# Altium footprint library Udemy_PCB_LIB.PcbLib: 35 footprints (part 2 of 3)
Each footprint in its own frame and in the unit in brackets; x right, y up, seen from the top. Pads: shape width x height; smd on the part's side, far side on the other; paste and mask are expansions set on the pad; w line width, h text height; cw(c..) or ccw(c..) is an arc to the next point about the centre after c.
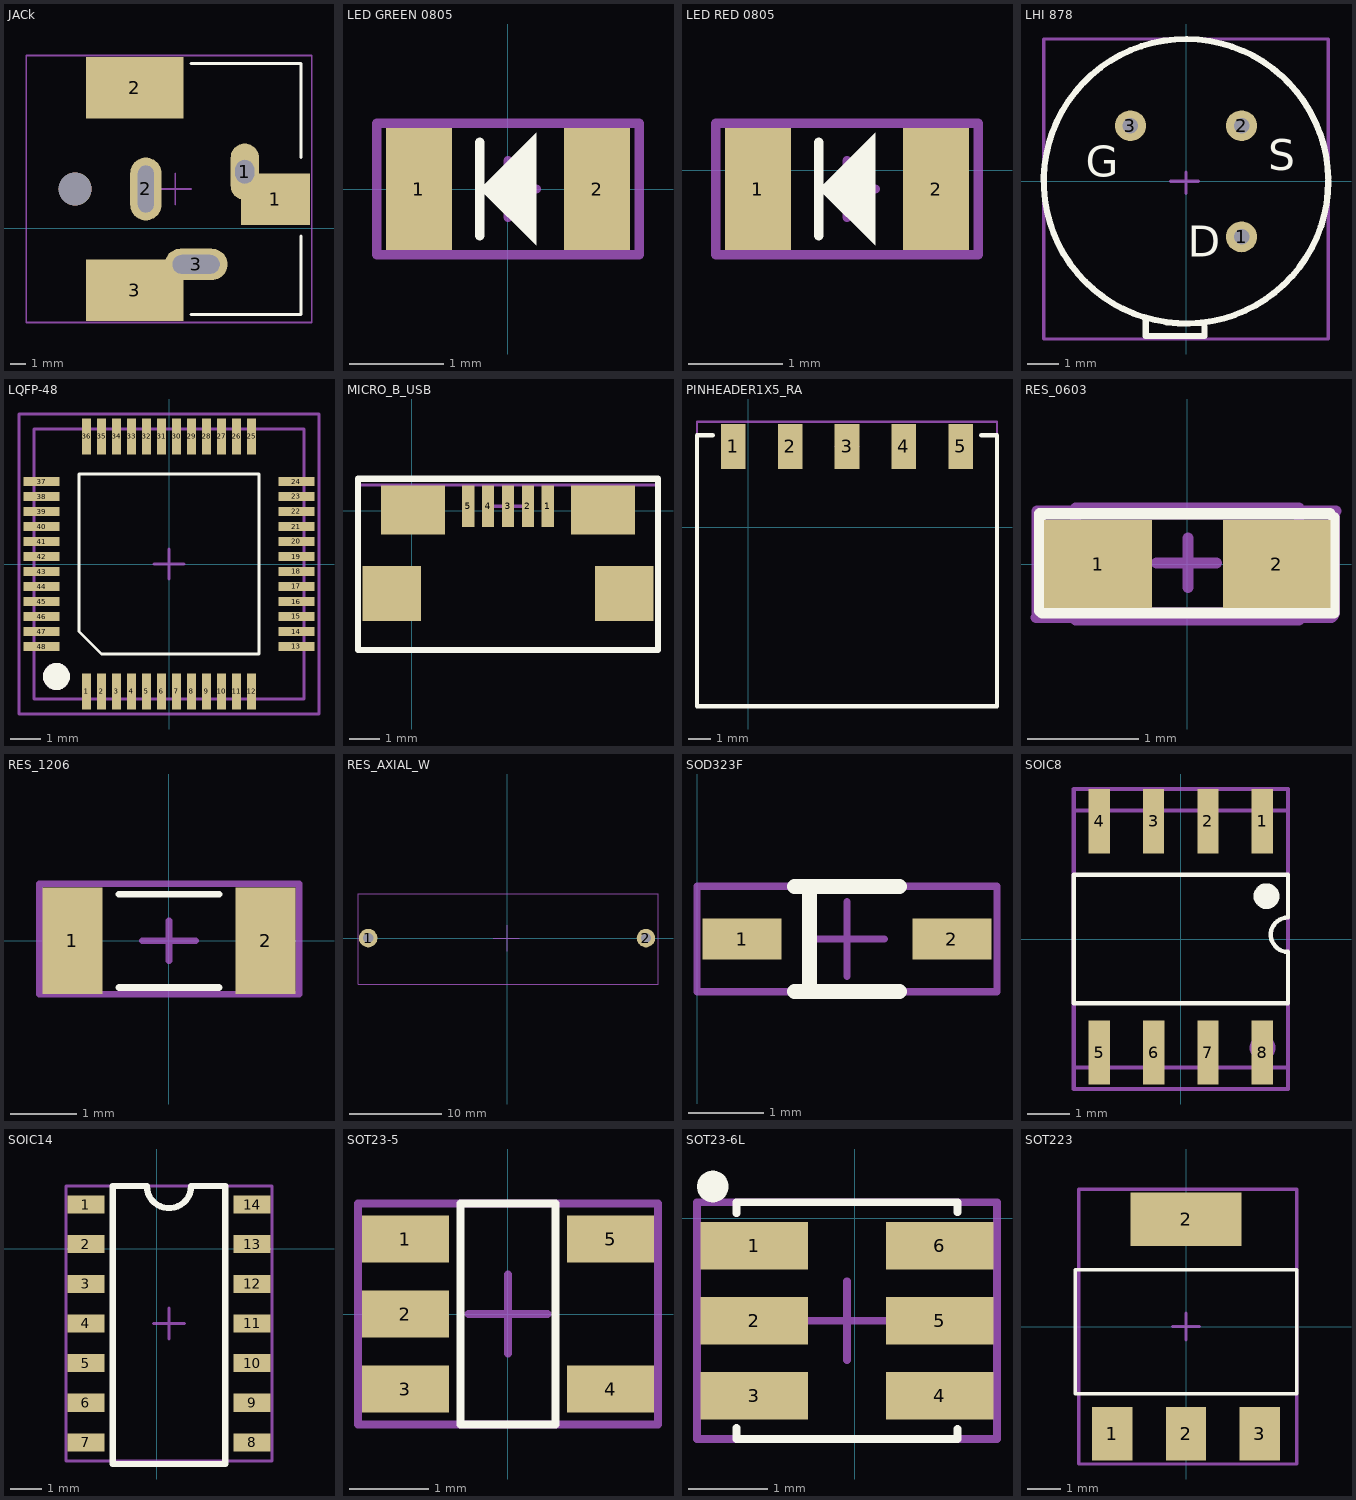
[diagram p1: the footprints below, top view; thin cyan lines are the x and y axes]

## JACk [mm]
pads (7):
  oval 1.8x3.6 hole 1.2 slot 1.5 at 90 deg: 1(18.025,3.6)
  rect 4.4x3.3 smd: 1(19.975,1.85)
  rect 6.2x3.9 smd: 2(11.025,8.95) 3(11.025,-3.95)
  oval 2x4 hole 1 slot 3 at 90 deg: 2(11.725,2.5)
  oval 4x2 hole 1.2 slot 3 at 0 deg: 3(14.925,-2.3)
  round 2.1 hole 2.1 unplated: ""(7.225,2.5)
Top Overlay:
  lines w0.2: 14.6,-5.5 21.6,-5.5 21.6,-0.5 ; 14.6,10.5 21.6,10.5 21.6,4.5
Top 3D Body:
  lines w0.1: 12.6,2.5 14.6,2.5 ; 13.6,1.5 13.6,3.5 ; 4.1,-6 4.1,11 7.6,11 22.3,11 22.3,-6 4.1,-6
Bottom Designator:
  lines w0.1: 4.1,-6 4.1,11 7.6,11 22.3,11 22.3,-6 4.1,-6
  text "'.Designator'" at 7.854,2.262 h1.52
3D body "CUI_DEVICES_PJ-037AH-SMT-TR.step": height 11.1, standoff -3.3, extent 4.125,-5.25 21.225,9.95

## LED GREEN 0805 [mm]
pads (2):
  rect 0.7x1.3 smd mask+0.05: 1(-0.95,0) 2(0.95,0)
Top Overlay:
  region: -0.3,0 0.3,0.6 0.3,-0.6
  lines w0.1: -0.3,-0.5 -0.3,0.5
Top 3D Body:
  lines w0.1: -0.3,0 0.3,0 ; 0,-0.3 0,0.3 ; -1.4,-0.7 1.4,-0.7 1.4,0.7 -1.4,0.7 -1.4,-0.7
Bottom Designator:
  lines w0.1: -1.4,-0.7 1.4,-0.7 1.4,0.7 -1.4,0.7 -1.4,-0.7
  text "'.Designator'" at -1.25,-0.317 h0.7
3D body "SMD_0805LED_GREEN.STEP": height 1.1, standoff 0, extent -1.01,-0.625 1.01,0.625

## LED RED 0805 [mm]
pads (2):
  rect 0.7x1.3 smd mask+0.05: 1(-3.15,-0.2) 2(-1.25,-0.2)
Top Overlay:
  region: -2.5,-0.2 -1.9,0.4 -1.9,-0.8
  lines w0.1: -2.5,-0.7 -2.5,0.3
Top 3D Body:
  lines w0.1: -2.5,-0.2 -1.9,-0.2 ; -2.2,-0.5 -2.2,0.1 ; -3.6,-0.9 -0.8,-0.9 -0.8,0.5 -3.6,0.5 -3.6,-0.9
Bottom Designator:
  lines w0.1: -3.6,-0.9 -0.8,-0.9 -0.8,0.5 -3.6,0.5 -3.6,-0.9
  text "'.Designator'" at -3.45,-0.517 h0.7
3D body "SMD_0805LED_RED.STEP": height 1.1, standoff 0, extent -3.21,-0.825 -1.19,0.425

## LHI 878 [mm]
pads (3):
  round 1 hole 0.5: 1(1.796,-1.796) 2(1.796,1.796) 3(-1.796,1.796)
Top Overlay:
  lines w0.05: -1.3,-5 -1.3,-4.5
  lines w0.2: -1.3,-4.5 -1.3,-5 0.6,-5 0.6,-4.7 ; 4.599,0.096 ccw(c0,0) 4.6,0
  text "D" at 0.054,-2.446 h1
  text "S" at 2.654,0.354 h1
  text "G" at -3.246,0.154 h1
Top Component Center:
  lines w0.1: -0.5,0 0.4,0 ; 0,-0.4 0,0.3 ; -4.6,-5.1 4.6,-5.1 4.6,4.6 -4.6,4.6 -4.6,-5.1
Top Designator:
  lines w0.1: -4.6,-5.1 -4.6,4.6 4.6,4.6 4.6,-5.1 -4.6,-5.1
  text ".Designator" at -2.746,-0.938 h1.52
3D body "User Library-LHI878.step": height 4.6, standoff -2.4, extent -4.6,-5.029 4.6,4.6

## LQFP-48 [mm] "7mm x 7mm"
pads (48):
  rect 0.3x1.2 smd mask+0.05: 1(-2.75,-4.25) 2(-2.25,-4.25) 3(-1.75,-4.25) 4(-1.25,-4.25) 5(-0.75,-4.25) 6(-0.25,-4.25) 7(0.25,-4.25) 8(0.75,-4.25) 9(1.25,-4.25) 10(1.75,-4.25) 11(2.25,-4.25) 12(2.75,-4.25) 25(2.75,4.25) 26(2.25,4.25) 27(1.75,4.25) 28(1.25,4.25) 29(0.75,4.25) 30(0.25,4.25) 31(-0.25,4.25) 32(-0.75,4.25) 33(-1.25,4.25) 34(-1.75,4.25) 35(-2.25,4.25) 36(-2.75,4.25)
  rect 1.2x0.3 smd mask+0.05: 13(4.25,-2.75) 14(4.25,-2.25) 15(4.25,-1.75) 16(4.25,-1.25) 17(4.25,-0.75) 18(4.25,-0.25) 19(4.25,0.25) 20(4.25,0.75) 21(4.25,1.25) 22(4.25,1.75) 23(4.25,2.25) 24(4.25,2.75) 37(-4.25,2.75) 38(-4.25,2.25) 39(-4.25,1.75) 40(-4.25,1.25) 41(-4.25,0.75) 42(-4.25,0.25) 43(-4.25,-0.25) 44(-4.25,-0.75) 45(-4.25,-1.25) 46(-4.25,-1.75) 47(-4.25,-2.25) 48(-4.25,-2.75)
Top Overlay:
  circle w0.5: c-3.75,-3.75 r0.2
  lines w0.1: -3,-2.25 -3,3 3,3 3,-3 -2.25,-3 -3,-2.25
Top Component Center:
  lines w0.1: -0.5,0 0.5,0 ; 0,-0.5 0,0.5 ; -5,-5 5,-5 5,5 -5,5 -5,-5
Top 3D Body:
  circle w0.5: c-3.75,-3.75 r0.2
  lines w0.1: -4.5,-4.5 4.5,-4.5 4.5,4.5 -4.5,4.5 -4.5,-4.5
Top Designator:
  lines w0.1: -5,-5 5,-5 5,5 -5,5 -5,-5
  text ".Designator" at -0.868,-0.508 h1.52
3D body "User Library-LQFP48_Grid_0_5.STEP": height 1.6, standoff 0, extent -4.5,-4.5 4.5,4.5

## MICRO_B_USB [mm]
pads (9):
  rect 0.4x1.35 smd mask+0.05: 1(4.44,0.144) 2(3.79,0.144) 3(3.14,0.144) 4(2.49,0.144) 5(1.84,0.144)
  rect 1.9x1.8 smd mask+0.05: ""(-0.66,-2.706) ""(6.94,-2.706)
  rect 2.1x1.6 smd mask+0.05: ""(0.04,0.021) ""(6.24,0.021)
Top Overlay:
  lines w0.2: -1.76,-4.556 -0.66,-4.556 8.04,-4.556 8.04,1.044 -1.76,1.044 -1.76,-4.556
Top 3D Body:
  lines w0.1: 2.64,0.144 3.64,0.144 ; 3.14,-0.356 3.14,0.644 ; -1.76,-4.556 8.04,-4.556 8.04,0.844 2.94,0.844 -1.76,0.844 -1.76,-4.556
Bottom Designator:
  lines w0.1: -1.76,-4.556 8.04,-4.556 8.04,0.844 2.94,0.844 -1.76,0.844 -1.76,-4.556
  text "'.Designator'" at -0.006,-2.094 h1.52
3D body "10118192C.stp": height 2.79, standoff -0.22, extent -0.816,-5.317 7.097,0.344

## PINHEADER1X5_RA [mm]
pads (5):
  rect 1.1x2 smd mask+0.05: 1(-0.68,3.6) 2(1.86,3.6) 3(4.4,3.6) 4(6.94,3.6) 5(9.48,3.6)
Top Overlay:
  lines w0.2: -1.6,4.1 -2.3,4.1 -2.3,-8 11.1,-8 11.1,4.1 10.4,4.1
Top 3D Body:
  lines w0.1: 3.9,3.6 4.9,3.6 ; 4.4,3.1 4.4,4.1 ; -2.3,-8 11.1,-8 11.1,4.7 -1.3,4.7 -2.3,4.7 -2.3,-8
Bottom Designator:
  lines w0.1: -2.3,-8 11.1,-8 11.1,4.7 -1.3,4.7 -2.3,4.7 -2.3,-8
  text "'.Designator'" at 0.054,-0.938 h1.52
3D body "SMH-105-02-L-S.stp": height 2.41, standoff -0.01, extent -2.204,-7.909 11.004,4.029

## RES_0603 [mil]
pads (2):
  rect 38x31 smd mask+1.97: 1(-31.5,0) 2(31.5,0)
Top Overlay:
  lines w3.94: 50.3,17.7 -52.1,17.7 -52.1,-16.5 -51.3,-17.3 51.7,-17.3 51.7,16.3
Top Component Center:
  lines w3.94: -10.8,0.3 10.2,0.3 ; 0.2,-8.3 0.2,9.1 ; -52.4,-17.3 51.7,-17.3 51.9,-17.5 51.9,17.5 51.7,17.7 -51.8,17.7 -51.8,-16.7 -52.4,-17.3
Top 3D Body:
  lines w3.94: -39.37,-19.68 -39.37,19.68 39.37,19.68 39.37,-19.68 -39.37,-19.68
Top Designator:
  lines w3.94: -53.4,-18.9 -53.1,-18.6 -53.1,18.7 52.4,18.7 51.5,17.8 51.5,-18.2 50.8,-18.9 -53.4,-18.9
  text ".Designator" at -39.86,-8.5 h19.68
3D body "0603S1.STEP": height 18.47, standoff 0.75, extent -39.37,-19.28 38.46,19.28

## RES_1206 [mm]
pads (2):
  rect 0.9x1.6 smd mask+0.05: 1(-1.45,0) 2(1.45,0)
Top Overlay:
  lines w0.1: -0.75,-0.7 0.75,-0.7 ; -0.75,0.7 0.75,0.7
Top Component Center:
  lines w0.1: -0.4,0 0.4,0 ; 0,-0.3 0,0.3 ; -1.942,-0.8 1.95,-0.8 1.95,0.855 -1.942,0.855 -1.942,-0.8
Top Designator:
  lines w0.1: -1.942,-0.8 1.95,-0.8 1.95,0.855 -1.942,0.855 -1.942,-0.8
  text ".Designator" at -1.6,-0.133 h0.5
3D body "CircuitWorks-RESISTOR 1206.step": height 0.53, standoff -0.03, extent -1.597,-0.835 1.603,0.825

## RES_AXIAL_W [mm]
pads (2):
  round 2 hole 1.1 mask+0.05: 1(-15,0) 2(15,0)
Top Component Center:
  lines w0.1: -12,4.8 16.3,4.8 16.3,-5 -16.1,-5 -16.1,4.8 -11.7,4.8 ; -1.5,0 1.3,0 ; 0,-1.4 0,1.4
Top Designator:
  lines w0.1: -12,4.8 16.3,4.8 16.3,-5 -16.1,-5 -16.1,4.8 -11.7,4.8
  text ".Designator" at -6.9,-1.534 h2
3D body: height 5, standoff -4, extent 14.617,-0.407 15.417,0.393
3D body: height 5.2, standoff 4.4, extent 6.317,-0.407 15.317,0.393
3D body: height 5, standoff -4, extent -15.4,-0.4 -14.6,0.4
3D body: height 5.2, standoff 4.4, extent -15.3,-0.4 -6.3,0.4
3D body: height 9.65, standoff 0, extent -11,-4.825 11,4.825

## SOD323F [mm]
pads (2):
  rect 1.05x0.55 smd mask+0.05: 1(0.6,-2.3) 2(3.4,-2.3)
Top Overlay:
  lines w0.2: 1.3,-3 2.7,-3 ; 1.3,-1.6 2.7,-1.6 ; 1.5,-2.9 1.5,-1.6
Top 3D Body:
  lines w0.1: 1.5,-2.3 2.5,-2.3 ; 2,-2.8 2,-1.8 ; 0,-3 4,-3 4,-1.6 1.6,-1.6 0,-1.6 0,-3
Bottom Designator:
  lines w0.1: 0,-3 0,-1.6 1.6,-1.6 4,-1.6 4,-3 0,-3
  text "'.Designator'" at 0.5,-2.667 h0.7
3D body "User Library-SOD323F-1.step": height 1, standoff 0, extent 0.75,-2.975 3.25,-1.625

## SOIC8 [mm]
pads (8):
  rect 0.5x1.5 smd mask+0.05: 1(1.905,2.75) 2(0.635,2.75) 3(-0.635,2.75) 4(-1.905,2.75) 5(-1.905,-2.65) 6(-0.635,-2.65) 7(0.635,-2.65) 8(1.905,-2.65)
Top Overlay:
  circle w0.4: c2,1 r0.1
  lines w0.1: -2.5,-1.5 -2.5,1.5 2.5,1.5 2.5,0.5 ccw(c2.5,0.1) 2.5,-0.3 2.5,-1.5 -2.5,-1.5
Mechanical 1:
  lines w0.1: -2.5,-3 2.5,-3 2.5,3 -2.5,3 -2.5,-3
Top Component Center:
  lines w0.1: -2.5,-3.5 -2.5,3.5 ; -2.5,-3.5 2.5,-3.5 ; -2.5,-3.5 2.5,-3.5 ; -2.5,3.5 2.5,3.5 ; -2.5,3.5 2.5,3.5 ; 2.5,-3.5 2.5,3.5 ; 2.5,-3.5 2.5,3.5
Top 3D Body:
  circle w0.4: c1.908,-2.54 r0.1
Top Designator:
  lines w0.1: -2.5,-3.5 2.5,-3.5 2.5,3.5 -2.5,3.5 ; -2.5,-3.5 -2.5,3.5 ; -2.5,-3.5 -2.5,3.5
  text ".Designator" at -0.305,-1.246 h1.32
3D body "User Library-SOIC-8-1.step": height -0.4, standoff -2.15, extent -2.45,-3.1 2.45,2.9

## SOIC14 [mm]
pads (14):
  rect 1.18x0.58 smd mask+0.05: 1(-2.26,1.41) 2(-2.26,0.14) 3(-2.26,-1.13) 4(-2.26,-2.4) 5(-2.26,-3.67) 6(-2.26,-4.94) 7(-2.26,-6.21) 8(3.06,-6.21) 9(3.06,-4.94) 10(3.06,-3.67) 11(3.06,-2.4) 12(3.06,-1.13) 13(3.06,0.14) 14(3.06,1.41)
Top Overlay:
  lines w0.2: -1.4,-6.9 2.2,-6.9 2.2,2 1.107,2 cw(c0.4,2) -0.307,2 -1.4,2 -1.4,-6.9
Top 3D Body:
  lines w0.1: -0.1,-2.4 0.9,-2.4 ; 0.4,-2.9 0.4,-1.9 ; -2.9,-6.8 -2.9,2 3.7,2 3.7,-6.8 -2.9,-6.8
Bottom Designator:
  lines w0.1: -2.9,-6.8 3.7,-6.8 3.7,2 -2.9,2 -2.9,-6.8
  text "'.Designator'" at -1.546,-2.538 h1.52
3D body "User Library-so14-1.step": height 1.7, standoff 0, extent -2.6,-6.8 3.4,2

## SOT23-5 [mm]
pads (5):
  rect 1.1x0.6 smd mask+0.05: 1(-1.3,0.95) 2(-1.3,0) 3(-1.3,-0.95) 4(1.3,-0.95) 5(1.3,0.95)
Top Overlay:
  lines w0.1: -0.6,-1.4 -0.6,1.4 0.6,1.4 0.6,-1.4 -0.6,-1.4
Top 3D Body:
  lines w0.1: -0.5,0 0.5,0 ; 0,-0.5 0,0.5 ; -1.9,-1.4 1.9,-1.4 1.9,1.4 -1.9,1.4 -1.9,-1.4
Bottom Designator:
  lines w0.1: -1.9,-1.4 -1.9,1.4 1.9,1.4 1.9,-1.4 -1.9,-1.4
  text "'.Designator'" at -1.6,-0.567 h1.3
3D body "OPA314AIDBVR.STEP": height 1.45, standoff 0, extent -1.4,-1.45 1.4,1.45

## SOT23-6L [mm]
pads (6):
  rect 1.36x0.6 smd mask+0.05: 1(-1.275,-0.35) 2(-1.275,-1.3) 3(-1.275,-2.25) 4(1.075,-2.25) 5(1.075,-1.3) 6(1.075,-0.35)
Top Overlay:
  circle w0.2: c-1.8,0.4 r0.1
  lines w0.1: -1.5,-2.661 -1.5,-2.8 -1.4,-2.8 1.3,-2.8 1.3,-2.674 ; -1.5,0.061 -1.5,0.2 -1.4,0.2 1.3,0.2 1.3,0.074
Top 3D Body:
  lines w0.1: -0.6,-1.3 0.4,-1.3 ; -0.1,-1.8 -0.1,-0.8 ; -2,-2.8 -2,0.2 1.8,0.2 1.8,-2.8 -2,-2.8
Bottom Designator:
  lines w0.1: -2,-2.8 -2,0.2 1.8,0.2 1.8,-2.8 -2,-2.8
  text "'.Designator'" at -1.98,-2.013 h1.4
3D body "USBLC6-2SC6.STEP": height 1.45, standoff 0, extent -1.5,-2.763 1.3,0.162

## SOT223 [mm]
pads (4):
  rect 1.2x1.6 smd: 1(-2.2,-3.2) 2(0,-3.2) 3(2.2,-3.2)
  rect 3.3x1.6 smd: 2(0,3.2)
Top Overlay:
  lines w0.1: -3.3,-2 -3.3,1.7 3.3,1.7 3.3,-2 -3.3,-2
Top Component Center:
  lines w0.1: -0.4,0 0.4,0 ; 0,-0.4 0,0.4 ; -3.2,-4.1 -3.2,-2.05 -3.2,-1.025 -3.2,1.025 -3.2,2.05 -3.2,4.1 3.3,4.1 3.3,-4.1 -3.2,-4.1
Top Designator:
  lines w0.1: -3.2,-4.1 -3.2,4.1 3.3,4.1 3.3,-4.1 -3.2,-4.1
  text ".Designator" at -1.646,-0.738 h1.52
3D body "User Library-SOT-223-1.step": height 1.64, standoff -0.01, extent -3.25,-3.5 3.25,3.5